# Altium footprint library My_PCB_6_28.PcbLib: 151 footprints (part 1 of 10)
Each footprint in its own frame and in the unit in brackets; x right, y up, seen from the top. Pads: shape width x height; smd on the part's side, far side on the other; paste and mask are expansions set on the pad; w line width, h text height; cw(c..) or ccw(c..) is an arc to the next point about the centre after c.
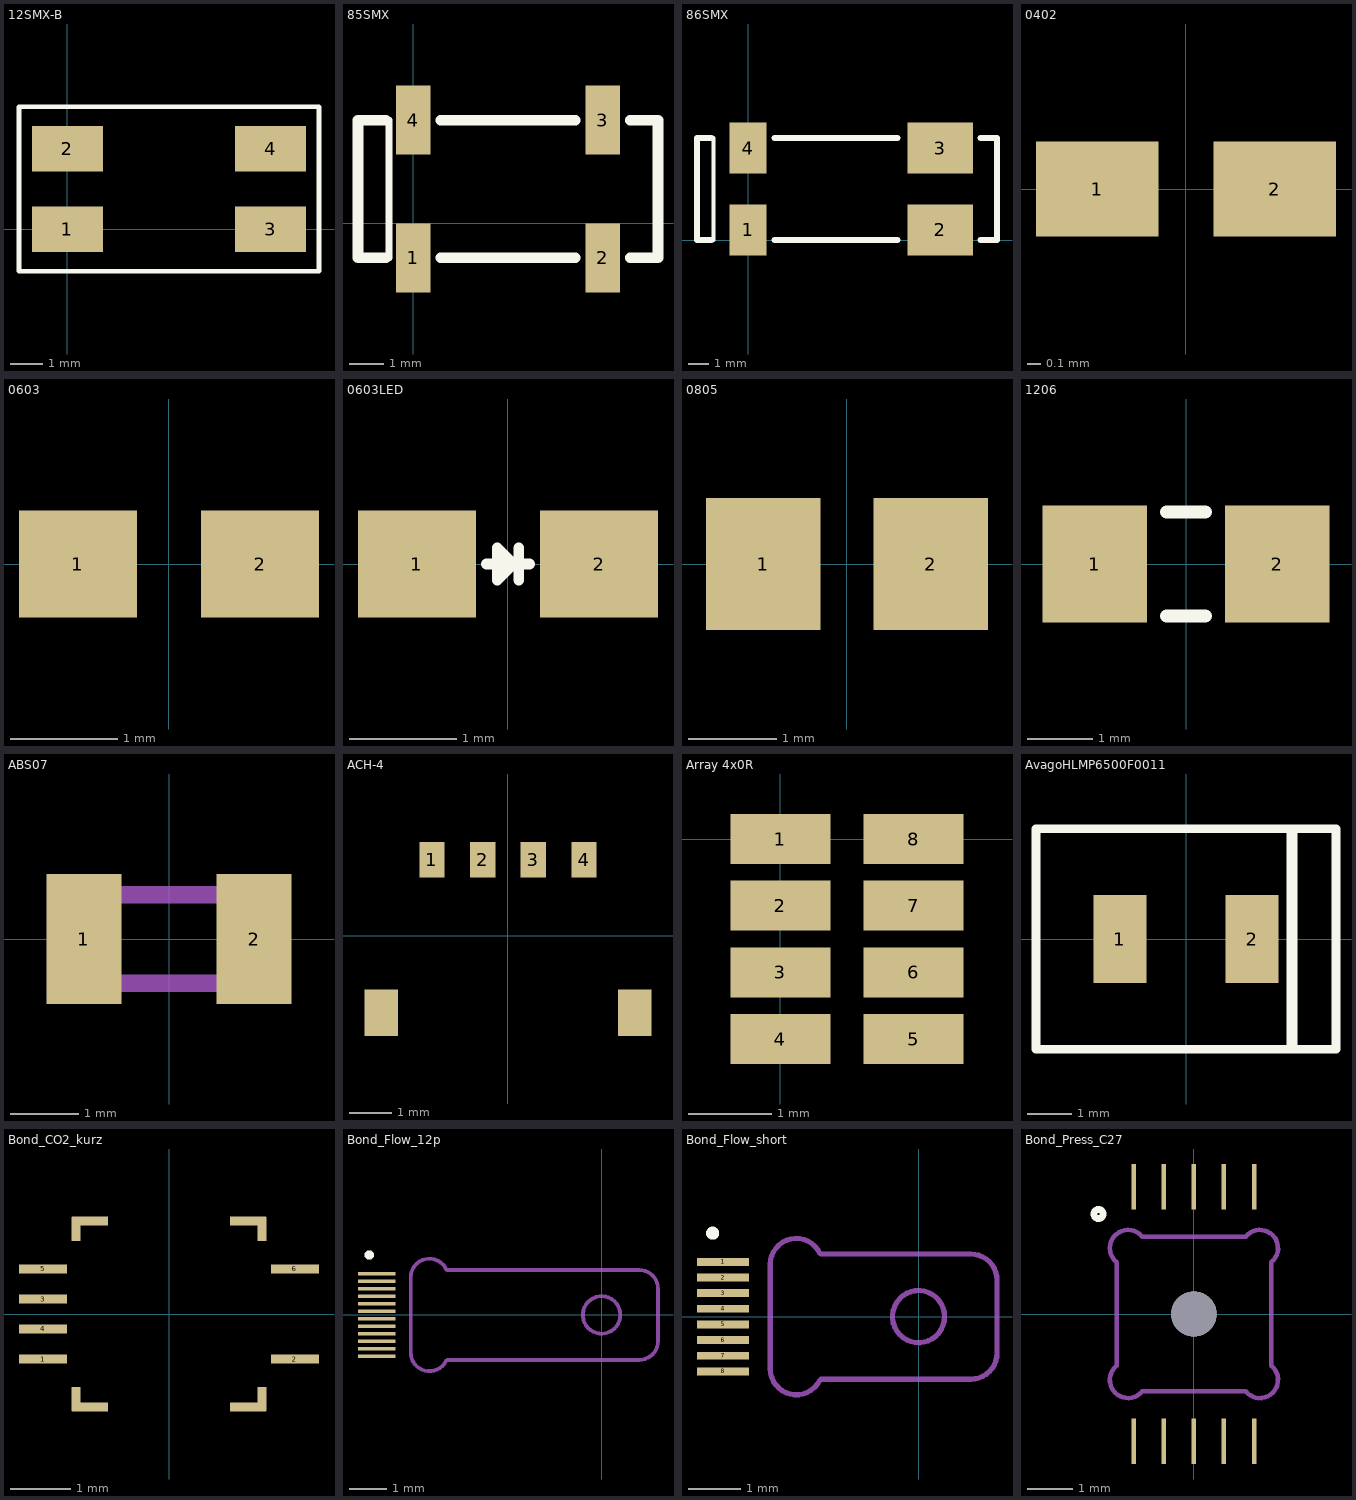
[diagram p0: the footprints below, top view; thin cyan lines are the x and y axes]

## 12SMX-B [mm] "12SMX-B"
height 1.4
pads (4):
  rect 2.2x1.4 smd: 1(0,0) 2(0,2.5) 3(6.3,0) 4(6.3,2.5)
Top Overlay:
  lines w0.15: -1.5,-1.3 7.8,-1.3 7.8,3.8 -1.5,3.8 -1.5,-1.3

## 85SMX [mm]
pads (4):
  rect 1x2 smd: 1(0,-1) 2(5.5,-1) 3(5.5,3) 4(0,3)
Top Overlay:
  lines w0.2: -0.7,-1 -0.7,3
  lines w0.305: -0.8,-1 -1.6,-1 -1.6,3 -0.8,3 ; 0.8,-1 4.7,-1 ; 0.8,3 4.7,3 ; 6.3,-1 7.1,-1 7.1,3 6.3,3

## 86SMX [mm]
pads (4):
  rect 1.8x2.5 smd: 1(0,0.5) 4(0,4.5)
  rect 3.2x2.5 smd: 2(9.4,0.5) 3(9.4,4.5)
Top Overlay:
  lines w0.2: -1.7,0 -1.7,5
  lines w0.305: -1.8,0 -2.5,0 -2.5,5 -1.8,5 ; 1.308,0 7.3,0 ; 1.308,5 7.3,5 ; 11.38,0 12.18,0 12.18,5 11.38,5

## 0402 [mm] "Chip Resistor; Body 1 x 0.5 mm (LxW typ)"
height 0.4
pads (2):
  rect 0.9x0.7 smd: 1(-0.65,0) 2(0.65,0)
3D body: height 0.35, standoff 0, extent -0.5,-0.25 0.5,0.25

## 0603 [mm] "Chip Resistor; Body 1.6 x 0.9 mm (LxW typ)"
height 0.55
pads (2):
  rect 1.1x1 smd: 1(-0.85,0) 2(0.85,0)
3D body: height 0.45, standoff 0, extent -0.8,-0.4 0.8,0.4

## 0603LED [mm] "Chip LED Body 1.6 x 0.9 mm (LxW typ)"
height 0.55
pads (2):
  rect 1.1x1 smd: 1(-0.85,0) 2(0.85,0)
Top Overlay:
  lines w0.1: -0.2,0 0.2,0 ; 0.1,-0.15 0.1,0.15 ; -0.1,-0.15 -0.1,0.15 0.05,0 -0.1,-0.15
3D body: height 0.73, standoff 0.05, extent -0.825,-0.35 0.825,0.375

## 0805 [mm] "Chip Resistor; Body 2 x 1.2 mm (LxW typ)"
height 0.7
pads (2):
  rect 1.3x1.5 smd: 1(-0.95,0) 2(0.95,0)
3D body: height 0.6, standoff 0, extent -1,-0.625 1,0.625

## 1206 [mm] "Chip Resistor; Body 3.1 x 1.6 mm (LxW typ)"
height 0.7
pads (2):
  rect 1.6x1.8 smd: 1(-1.4,0) 2(1.4,0)
Top Overlay:
  lines w0.2: -0.3,-0.8 0.3,-0.8 ; -0.3,0.8 0.3,0.8
3D body: height 0.55, standoff 0, extent -1.6,-0.8 1.6,0.8

## ABS07 [mm] "quartz crystal, Typ: ABS07 bzw. CM315, 3.2x1.5x0.9mm"
height 0.9
pads (2):
  rect 1.1x1.9 smd: 1(-1.25,0) 2(1.25,0)
Mechanical 13:
  lines w0.254: 1.575,-0.625 1.6,-0.65 ; 1.575,0.65 -1.6,0.65 -1.6,-0.65 -1.225,-0.65 1.6,-0.65 ; 1.6,0.65 1.6,-0.65
3D body: height 0.9, standoff 0, extent -1.727,-0.777 1.727,0.777

## ACH-4 [mm]
height 1.4
pads (6):
  rect 0.6x0.85 smd: 1(-1.8,1.8) 2(-0.6,1.8) 3(0.6,1.8) 4(1.8,1.8)
  rect 0.8x1.1 smd: ""(-3,-1.825) ""(3,-1.825)
3D body: height 1.4, standoff -0.05, extent -3.3,-2.45 3.3,1.85

## Array 4x0R [mm]
pads (8):
  rect 1.2x0.6 smd: 1(0,0) 2(0,-0.8) 3(0,-1.6) 4(0,-2.4) 5(1.6,-2.4) 6(1.6,-1.6) 7(1.6,-0.8) 8(1.6,0)

## AvagoHLMP6500F0011 [mm]
height 3
pads (2):
  rect 1.2x2 smd: 1(-1.5,0) 2(1.5,0)
Top Overlay:
  lines w0.2: -3.4,-2.5 3.4,-2.5 3.4,2.5 -3.4,2.5 -3.4,0 -3.4,-2.5
  lines w0.254: 2.4,-2.4 2.4,2.4

## Bond_CO2_kurz [mm] "CO2sensor 2,56*2,6mm"
pads (14):
  rect 0.8x0.15 smd paste-1: 1(-2.1,-0.75) 2(2.1,-0.75) 3(-2.1,0.25) 4(-2.1,-0.25) 5(-2.1,0.75) 6(2.1,0.75)
  rect 0.15x0.4 smd paste-1: ""(-1.55,-1.42) ""(-1.55,1.42) ""(1.55,-1.42) ""(1.55,1.42)
  rect 0.6x0.15 smd paste-1: ""(-1.32,-1.55) ""(-1.32,1.55) ""(1.32,-1.55) ""(1.32,1.55)
3D body: height 0.41, standoff 0, extent -1.303,-1.3 1.303,1.28

## Bond_Flow_12p [mm] "Chip in PCB-Tasche buendig einkleben"
pads (12):
  rect 1x0.1 smd paste-1: 1(-6,1.1) 2(-6,0.9) 3(-6,0.7) 4(-6,0.5) 5(-6,0.3) 6(-6,0.1) 7(-6,-0.1) 8(-6,-0.3) 9(-6,-0.5) 10(-6,-0.7) 11(-6,-0.9) 12(-6,-1.1)
Top Overlay:
  circle w0.15: c-6.2,1.6 r0.05
Mechanical 13:
  lines w0.1: -4.149,-1.227 cw(c-4.595,-1) -5.095,-1 -5.095,1 cw(c-4.595,1) -4.142,1.211 ; -4.12,-1.2 1.005,-1.2 ccw(c1.005,-0.7) 1.505,-0.7 1.505,0.7 ccw(c1.005,0.7) 1.005,1.2 -4.12,1.2
Mechanical 15:
  circle w0.1: c0,0 r0.5

## Bond_Flow_short [mm] "Chip in PCB-Tasche buendig einkleben"
pads (8):
  rect 1x0.15 smd paste-1: 1(-3.75,1.05) 2(-3.75,0.75) 3(-3.75,0.45) 4(-3.75,0.15) 5(-3.75,-0.15) 6(-3.75,-0.45) 7(-3.75,-0.75) 8(-3.75,-1.05)
Top Overlay:
  circle w0.15: c-3.95,1.6 r0.05
Mechanical 13:
  lines w0.1: -1.899,-1.227 cw(c-2.345,-1) -2.845,-1 -2.845,1 cw(c-2.345,1) -1.892,1.211 ; -1.87,-1.2 1.005,-1.2 ccw(c1.005,-0.7) 1.505,-0.7 1.505,0.7 ccw(c1.005,0.7) 1.005,1.2 -1.87,1.2
Mechanical 15:
  circle w0.1: c0,0 r0.5
3D body: height 0, standoff -0.38, extent -2.625,-0.95 1.125,0.975

## Bond_Press_C27 [mm] "Drucksensor 3,05*3,05mm"
pads (11):
  rect 0.1x1 smd paste-1: 1(-1.325,2.8) 2(-0.66,2.8) 3(0,2.8) 4(0.66,2.8) 5(1.325,2.8) 6(1.325,-2.8) 7(0.66,-2.8) 8(0,-2.8) 9(-0.66,-2.8) 10(-1.325,-2.8)
  round 1 hole 1 paste-1 mask+0.102: ""(0,0)
Top Overlay:
  circle w0.15: c-2.1,2.2 r0.1
Mechanical 2:
  lines w0.1: -1.712,1.147 cw(c-1.45,1.45) -1.147,1.712 ; -1.704,-1.141 ccw(c-1.45,-1.45) -1.144,-1.707 ; -1.7,-1.14 -1.7,1.14 ; -1.14,-1.7 1.14,-1.7 ; -1.14,1.7 1.14,1.7 ; 1.137,-1.699 ccw(c1.45,-1.45) 1.699,-1.137 ; 1.139,1.702 cw(c1.45,1.45) 1.696,1.135 ; 1.7,-1.14 1.7,1.14